# Altium schematic symbol library IC_ADI.SCHLIB: 3169 symbols (part 14 of 181)
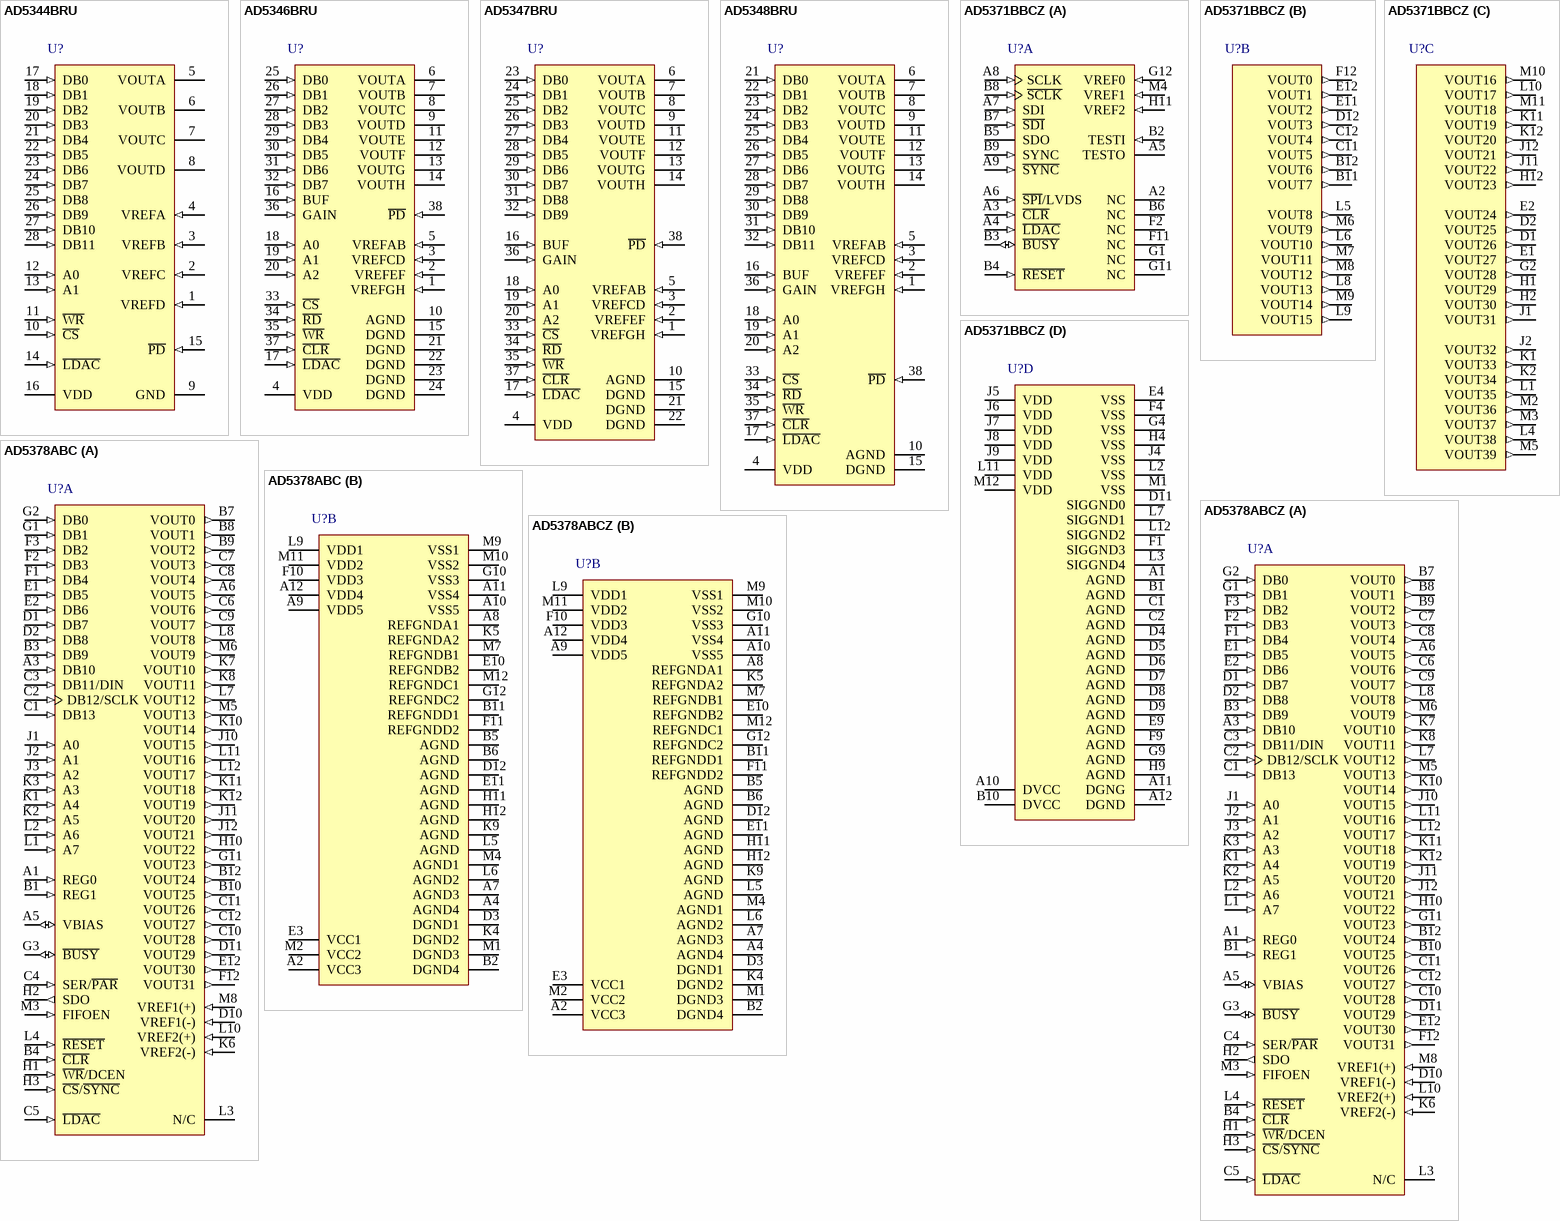
[diagram p204: symbols AD5344BRU to AD5378ABCZ]

## AD5348BRU
designator U?
Octal 12-Bit Voltage Output Digital-to-Analog Converter, 2.5 to 5.5 V, -40 to +105 degC, RU-38, Tube; Generic Part Number: AD5348; PartNumber: AD5348BRU; # DAC Outputs: 8; Max V+: 5.5V; Op Pwr Diss: 8.3mW; Resolution (Bits): 12; Settling Time: 8祍; Single Supply: Yes; DatasheetVersion: Rev.0; PackageVersion: Mar-2003; PackageReference: RU-38; PackageDescription: 38-Lead Thin Shrink Small Outline Package [TSSOP]; Supplier Part Number 1: AD5348BRU-ND; Supplier Part Number 2: 584-AD5348BRU; Packing: Tube; RoHS: N; Mounting Technology: Surface Mount; Code_JEDEC: MS-153BD-1; ComponentLink1Description: Manufacturer URL; ComponentLink2Description: Datasheet; ComponentLink3Description: Package Specification; ComponentLink4Description: Product URL
footprint TSSOP38_0.5 (Footprint not found)
pins: 1 VREFGH (in) "Reference Input for DACs G and H.", 2 VREFEF (in) "Reference Input for DACs E and F.", 3 VREFCD (in) "Reference Input for DACs C and D.", 4 VDD (power) "Power Supply Pin(s). This part can operate from 2.5 V to 5.5 V, and the supply should be decoupled with a 10 uF capacitor in parallel with a 0.1 uF capacitor to GND. Both VDD pins on the LFCSP package must be at the same (See Datasheet)", 5 VREFAB (in) "Reference Input for DACs A and B.", 6 VOUTA (hiz) "Output of DAC A. Buffered output with rail-to-rail operation.", 7 VOUTB (hiz) "Output of DAC B. Buffered output with rail-to-rail operation.", 8 VOUTC (hiz) "Output of DAC C. Buffered output with rail-to-rail operation.", 9 VOUTD (hiz) "Output of DAC D. Buffered output with rail-to-rail operation.", 10 AGND (power) "Analog Ground. Ground reference for analog circuitry.", 11 VOUTE (hiz) "Output of DAC E. Buffered output with rail-to-rail operation.", 12 VOUTF (hiz) "Output of DAC F. Buffered output with rail-to-rail operation.", 13 VOUTG (hiz) "Output of DAC G. Buffered output with rail-to-rail operation.", 14 VOUTH (hiz) "Output of DAC H. Buffered output with rail-to-rail operation.", 15 DGND (power) "Digital Ground. Ground reference for digital circuitry.", 16 BUF (in) "Buffer Control Pin. Controls whether the reference input to the DAC is buffered or unbuffered.", 17 ~{LDAC} (in) "Active Low Control Input. Updates the DAC registers with the contents of the input registers, which allows all DAC outputs to be simultaneously updated.", 18 A0 (in) "LSB Address Pin. Selects which DAC is to be written to.", 19 A1 (in) "Address Pin. Selects which DAC is to be written to.", 20 A2 (in) "MSB Address Pin. Selects which DAC is to be written to.", 21 DB0 (in) "Twelve Parallel Data Input.", 22 DB1 (in) "Twelve Parallel Data Input.", 23 DB2 (in) "Twelve Parallel Data Input.", 24 DB3 (in) "Twelve Parallel Data Input.", 25 DB4 (in) "Twelve Parallel Data Input.", 26 DB5 (in) "Twelve Parallel Data Input.", 27 DB6 (in) "Twelve Parallel Data Input.", 28 DB7 (in) "Twelve Parallel Data Input.", 29 DB8 (in) "Twelve Parallel Data Input.", 30 DB9 (in) "Twelve Parallel Data Input.", 31 DB10 (in) "Twelve Parallel Data Input.", 32 DB11 (in) "Twelve Parallel Data Input. DB11 is the MSB of these 12 bits.", 33 ~{CS} (in) "Active Low Chip Select Input. Used in conjunction with W\R\ to write data to the parallel interface, or with R\D\ to read back data from a DAC.", 34 ~{RD} (in) "Active Low Read Input. Used in conjunction with C\S\ to read data back from the internal DACs.", 35 ~{WR} (in) "Active Low Write Input. Used in conjunction with C\S\ to write data to the parallel interface.", 36 GAIN (in) "Gain Control Pin. Controls whether the output range from the DAC is 0 V to VREF or 0 V to 2 x VREF.", 37 ~{CLR} (in) "Asynchronous Active Low Control Input. Clears all input registers and DAC registers to zeros.", 38 ~{PD} (in) "Power-Down Pin. This active low control pin puts all DACs into power-down mode."

## AD5371BBCZ
designator U?
14-Bit Voltage Output Digital-to-Analog Converter with Serial Interface, -40 to +85 degC, BC-100-2, Pb-Free, Tray; Generic Part Number: AD5371; PartNumber: AD5371BBCZ; # DAC Outputs: 40; Max V+: 16.5V; Op Pwr Diss: 580mW; Resolution (Bits): 14; Settling Time: 20祍; Single Supply: No; DatasheetVersion: Rev.B; PackageVersion: 012006-0; PackageReference: BC-100-2; PackageDescription: 100-Ball Chip Scale Package Ball Grid Array [CSP_BGA]; Supplier Part Number 1: AD5371BBCZ-ND; Supplier Part Number 2: 584-AD5371BBCZ; Packing: Tray; RoHS: Y; Mounting Technology: Surface Mount; Code_JEDEC: MO-205-AC*; ComponentLink1Description: Manufacturer URL; ComponentLink2Description: Datasheet; ComponentLink3Description: Package Specification; ComponentLink4Description: Product URL
footprint BGA100_0.8(10X10) (Footprint not found)
part A pins: A2 NC "No Connect. Do not connect these pins.", A3 ~{CLR} (in) "Asynchronous Clear Input (Level Sensitive, Active Low). See the Clear Function section for more information.", A4 ~{LDAC} (in) "Load DAC Logic Input (Active Low). See the B\U\S\Y\ and L\D\A\C\ Functions section for more information.", A5 TESTO "Test Output Pin. This pin remains unconnected.", A6 ~{SPI}/LVDS (in) "Interface Selection Pin. If the pin is low, the SPI interface is selected. If the pin is high, the LVDS interface is selected.", A7 SDI (in) "Serial Data Input for SPI or LVDS Interface. See the Timing Characteristics section for more details.", A8 SCLK (in) "Serial Clock Input for SPI or LVDS Interface. See the Timing Characteristics section for more details.", A9 ~{SYNC} (in) "Active Low or Differential S\Y\N\C\ Input (Complement) for SPI or LVDS Interface. This is the frame synchronization signal for the SPI or LVDS serial interface. See the Timing Characteristics section for more details.", B2 TESTI (in) "Test Input Pin. Connect this pin to DGND.", B3 ~{BUSY} (io) "Digital Input/Open-Drain Output. B\U\S\Y\ is open drain when an output. See the B\U\S\Y\ and L\D\A\C\ Functions section for more information.", B4 ~{RESET} (in) "Digital Reset Input.", B5 SDO (hiz) "Serial Data Output for SPI Interface. CMOS output. SDO can be used for readback. Data is clocked out on SDO on the rising edge of SCLK and is valid on the falling edge of SCLK.", B6 NC "No Connect. Do not connect these pins.", B7 ~{SDI} (in) "Differential Serial Data Input (Complement) for LVDS Interface. See the Timing Characteristicssection for more details.", B8 ~{SCLK} (in) "Differential Serial Clock Input (Complement) for LVDS Interface. See the Timing Characteristics section for more details.", B9 SYNC (in) "Differential SYNC Input for LVDS Interface. This is the frame synchronization signal for the LVDS serial interface. See the Timing Characteristics section for more details.", F2 NC "No Connect. Do not connect these pins.", F11 NC, G1 NC "No Connect. Do not connect these pins.", G11 NC "No Connect. Do not connect these pins.", G12 VREF0 (in) "Reference Input for DAC 0 to DAC 7. This reference voltage is referred to AGND.", H11 VREF2 (in) "Reference Input for DAC 16 to DAC 39. This reference voltage is referred to AGND.", M4 VREF1 (in) "Reference Input for DAC 8 to DAC 15. This reference voltage is referred to AGND."
part B pins: B11 VOUT7 (out) "DAC Output. Buffered analog outputs for each of the 40 DAC channels. Each analog output is capable of driving an output load of 10 k ohm to ground. Typical output impedance of these amplifiers is 0.5 ohm.", B12 VOUT6 (out) "DAC Output. Buffered analog outputs for each of the 40 DAC channels. Each analog output is capable of driving an output load of 10 k ohm to ground. Typical output impedance of these amplifiers is 0.5 ohm.", C11 VOUT5 (out) "DAC Output. Buffered analog outputs for each of the 40 DAC channels. Each analog output is capable of driving an output load of 10 k ohm to ground. Typical output impedance of these amplifiers is 0.5 ohm.", C12 VOUT4 (out) "DAC Output. Buffered analog outputs for each of the 40 DAC channels. Each analog output is capable of driving an output load of 10 k ohm to ground. Typical output impedance of these amplifiers is 0.5 ohm.", D12 VOUT3 (out) "DAC Output. Buffered analog outputs for each of the 40 DAC channels. Each analog output is capable of driving an output load of 10 k ohm to ground. Typical output impedance of these amplifiers is 0.5 ohm.", E11 VOUT2 (out) "DAC Output. Buffered analog outputs for each of the 40 DAC channels. Each analog output is capable of driving an output load of 10 k ohm to ground. Typical output impedance of these amplifiers is 0.5 ohm.", E12 VOUT1 (out) "DAC Output. Buffered analog outputs for each of the 40 DAC channels. Each analog output is capable of driving an output load of 10 k ohm to ground. Typical output impedance of these amplifiers is 0.5 ohm.", F12 VOUT0 (out) "DAC Output. Buffered analog outputs for each of the 40 DAC channels. Each analog output is capable of driving an output load of 10 k ohm to ground. Typical output impedance of these amplifiers is 0.5 ohm.", L5 VOUT8 (out) "DAC Output. Buffered analog outputs for each of the 40 DAC channels. Each analog output is capable of driving an output load of 10 k ohm to ground. Typical output impedance of these amplifiers is 0.5 ohm.", L6 VOUT10 (out) "DAC Output. Buffered analog outputs for each of the 40 DAC channels. Each analog output is capable of driving an output load of 10 k ohm to ground. Typical output impedance of these amplifiers is 0.5 ohm.", L8 VOUT13 (out) "DAC Output. Buffered analog outputs for each of the 40 DAC channels. Each analog output is capable of driving an output load of 10 k ohm to ground. Typical output impedance of these amplifiers is 0.5 ohm.", L9 VOUT15 (out) "DAC Output. Buffered analog outputs for each of the 40 DAC channels. Each analog output is capable of driving an output load of 10 k ohm to ground. Typical output impedance of these amplifiers is 0.5 ohm.", M6 VOUT9 (out) "DAC Output. Buffered analog outputs for each of the 40 DAC channels. Each analog output is capable of driving an output load of 10 k ohm to ground. Typical output impedance of these amplifiers is 0.5 ohm.", M7 VOUT11 (out) "DAC Output. Buffered analog outputs for each of the 40 DAC channels. Each analog output is capable of driving an output load of 10 k ohm to ground. Typical output impedance of these amplifiers is 0.5 ohm.", M8 VOUT12 (out) "DAC Output. Buffered analog outputs for each of the 40 DAC channels. Each analog output is capable of driving an output load of 10 k ohm to ground. Typical output impedance of these amplifiers is 0.5 ohm.", M9 VOUT14 (out) "DAC Output. Buffered analog outputs for each of the 40 DAC channels. Each analog output is capable of driving an output load of 10 k ohm to ground. Typical output impedance of these amplifiers is 0.5 ohm."
part C pins: D1 VOUT26 (out) "DAC Output. Buffered analog outputs for each of the 40 DAC channels. Each analog output is capable of driving an output load of 10 k ohm to ground. Typical output impedance of these amplifiers is 0.5 ohm.", D2 VOUT25 (out) "DAC Output. Buffered analog outputs for each of the 40 DAC channels. Each analog output is capable of driving an output load of 10 k ohm to ground. Typical output impedance of these amplifiers is 0.5 ohm.", E1 VOUT27 (out) "DAC Output. Buffered analog outputs for each of the 40 DAC channels. Each analog output is capable of driving an output load of 10 k ohm to ground. Typical output impedance of these amplifiers is 0.5 ohm.", E2 VOUT24 (out) "DAC Output. Buffered analog outputs for each of the 40 DAC channels. Each analog output is capable of driving an output load of 10 k ohm to ground. Typical output impedance of these amplifiers is 0.5 ohm.", G2 VOUT28 (out) "DAC Output. Buffered analog outputs for each of the 40 DAC channels. Each analog output is capable of driving an output load of 10 k ohm to ground. Typical output impedance of these amplifiers is 0.5 ohm.", H1 VOUT29 (out) "DAC Output. Buffered analog outputs for each of the 40 DAC channels. Each analog output is capable of driving an output load of 10 k ohm to ground. Typical output impedance of these amplifiers is 0.5 ohm.", H2 VOUT30 (out) "DAC Output. Buffered analog outputs for each of the 40 DAC channels. Each analog output is capable of driving an output load of 10 k ohm to ground. Typical output impedance of these amplifiers is 0.5 ohm.", H12 VOUT23 (out) "DAC Output. Buffered analog outputs for each of the 40 DAC channels. Each analog output is capable of driving an output load of 10 k ohm to ground. Typical output impedance of these amplifiers is 0.5 ohm.", J1 VOUT31 (out) "DAC Output. Buffered analog outputs for each of the 40 DAC channels. Each analog output is capable of driving an output load of 10 k ohm to ground. Typical output impedance of these amplifiers is 0.5 ohm.", J2 VOUT32 (out) "DAC Output. Buffered analog outputs for each of the 40 DAC channels. Each analog output is capable of driving an output load of 10 k ohm to ground. Typical output impedance of these amplifiers is 0.5 ohm.", J11 VOUT22 (out) "DAC Output. Buffered analog outputs for each of the 40 DAC channels. Each analog output is capable of driving an output load of 10 k ohm to ground. Typical output impedance of these amplifiers is 0.5 ohm.", J12 VOUT21 (out) "DAC Output. Buffered analog outputs for each of the 40 DAC channels. Each analog output is capable of driving an output load of 10 k ohm to ground. Typical output impedance of these amplifiers is 0.5 ohm.", K1 VOUT33 (out) "DAC Output. Buffered analog outputs for each of the 40 DAC channels. Each analog output is capable of driving an output load of 10 k ohm to ground. Typical output impedance of these amplifiers is 0.5 ohm.", K2 VOUT34 (out) "DAC Output. Buffered analog outputs for each of the 40 DAC channels. Each analog output is capable of driving an output load of 10 k ohm to ground. Typical output impedance of these amplifiers is 0.5 ohm.", K11 VOUT19 (out) "DAC Output. Buffered analog outputs for each of the 40 DAC channels. Each analog output is capable of driving an output load of 10 k ohm to ground. Typical output impedance of these amplifiers is 0.5 ohm.", K12 VOUT20 (out) "DAC Output. Buffered analog outputs for each of the 40 DAC channels. Each analog output is capable of driving an output load of 10 k ohm to ground. Typical output impedance of these amplifiers is 0.5 ohm.", L1 VOUT35 (out) "DAC Output. Buffered analog outputs for each of the 40 DAC channels. Each analog output is capable of driving an output load of 10 k ohm to ground. Typical output impedance of these amplifiers is 0.5 ohm.", L4 VOUT38 (out) "DAC Output. Buffered analog outputs for each of the 40 DAC channels. Each analog output is capable of driving an output load of 10 k ohm to ground. Typical output impedance of these amplifiers is 0.5 ohm.", L10 VOUT17 (out) "DAC Output. Buffered analog outputs for each of the 40 DAC channels. Each analog output is capable of driving an output load of 10 k ohm to ground. Typical output impedance of these amplifiers is 0.5 ohm.", M2 VOUT36 (out) "DAC Output. Buffered analog outputs for each of the 40 DAC channels. Each analog output is capable of driving an output load of 10 k ohm to ground. Typical output impedance of these amplifiers is 0.5 ohm.", M3 VOUT37 (out) "DAC Output. Buffered analog outputs for each of the 40 DAC channels. Each analog output is capable of driving an output load of 10 k ohm to ground. Typical output impedance of these amplifiers is 0.5 ohm.", M5 VOUT39 (out) "DAC Output. Buffered analog outputs for each of the 40 DAC channels. Each analog output is capable of driving an output load of 10 k ohm to ground. Typical output impedance of these amplifiers is 0.5 ohm.", M10 VOUT16 (out) "DAC Output. Buffered analog outputs for each of the 40 DAC channels. Each analog output is capable of driving an output load of 10 k ohm to ground. Typical output impedance of these amplifiers is 0.5 ohm.", M11 VOUT18 (out) "DAC Output. Buffered analog outputs for each of the 40 DAC channels. Each analog output is capable of driving an output load of 10 k ohm to ground. Typical output impedance of these amplifiers is 0.5 ohm."
part D pins: A1 AGND (power) "Ground for All Analog Circuitry. Connect the AGND pin to the AGND plane.", A10 DVCC (power) "Logic Power Supply; 2.5 V to 5.5 V. Decouple these pins with 0.1 uF ceramic capacitors and 10 uF capacitors.", A11 DGNG (power) "Ground for All Digital Circuitry. Connect both DGND pins to the DGND plane.", A12 DGND (power) "Ground for All Digital Circuitry. Connect both DGND pins to the DGND plane.", B1 AGND (power) "Ground for All Analog Circuitry. Connect the AGND pin to the AGND plane.", B10 DVCC (power) "Logic Power Supply; 2.5 V to 5.5 V. Decouple these pins with 0.1 uF ceramic capacitors and 10 uF capacitors.", C1 AGND (power) "Ground for All Analog Circuitry. Connect the AGND pin to the AGND plane.", C2 AGND (power) "Ground for All Analog Circuitry. Connect the AGND pin to the AGND plane.", D4 AGND (power) "Ground for All Analog Circuitry. Connect the AGND pin to the AGND plane.", D5 AGND (power) "Ground for All Analog Circuitry. Connect the AGND pin to the AGND plane.", D6 AGND (power) "Ground for All Analog Circuitry. Connect the AGND pin to the AGND plane.", D7 AGND (power) "Ground for All Analog Circuitry. Connect the AGND pin to the AGND plane.", D8 AGND (power) "Ground for All Analog Circuitry. Connect the AGND pin to the AGND plane.", D9 AGND (power) "Ground for All Analog Circuitry. Connect the AGND pin to the AGND plane.", D11 SIGGND0 (power) "Reference Ground for DAC 0 to DAC 7. VOUT0 to VOUT7 are referenced to this voltage.", E4 VSS (power) "Negative Analog Power Supply; ?16.5 V to ?8 V for specified performance. Decouple these pins with 0.1 uF ceramic capacitors and 10 uF capacitors.", E9 AGND (power) "Ground for All Analog Circuitry. Connect the AGND pin to the AGND plane.", F1 SIGGND3 (power) "Reference Ground for DAC 24 to DAC 31. VOUT24 to VOUT31 are referenced to this voltage.", F4 VSS (power) "Negative Analog Power Supply; ?16.5 V to ?8 V for specified performance. Decouple these pins with 0.1 uF ceramic capacitors and 10 uF capacitors.", F9 AGND (power) "No Connect. Do not connect these pins.", G4 VSS (power) "Negative Analog Power Supply; ?16.5 V to ?8 V for specified performance. Decouple these pins with 0.1 uF ceramic capacitors and 10 uF capacitors.", G9 AGND (power) "Ground for All Analog Circuitry. Connect the AGND pin to the AGND plane.", H4 VSS (power) "Negative Analog Power Supply; ?16.5 V to ?8 V for specified performance. Decouple these pins with 0.1 uF ceramic capacitors and 10 uF capacitors.", H9 AGND (power) "Ground for All Analog Circuitry. Connect the AGND pin to the AGND plane.", J4 VSS (power) "Negative Analog Power Supply; ?16.5 V to ?8 V for specified performance. Decouple these pins with 0.1 uF ceramic capacitors and 10 uF capacitors.", J5 VDD (power) "Positive Analog Power Supply; 9 V to 16.5 V for specified performance. Decouple these pins with 0.1 uF ceramic capacitors and 10 uF capacitors.", J6 VDD (power) "Positive Analog Power Supply; 9 V to 16.5 V for specified performance. Decouple these pins with 0.1 uF ceramic capacitors and 10 uF capacitors.", J7 VDD (power) "Positive Analog Power Supply; 9 V to 16.5 V for specified performance. Decouple these pins with 0.1 uF ceramic capacitors and 10 uF capacitors.", J8 VDD (power) "Positive Analog Power Supply; 9 V to 16.5 V for specified performance. Decouple these pins with 0.1 uF ceramic capacitors and 10 uF capacitors.", J9 VDD (power) "Positive Analog Power Supply; 9 V to 16.5 V for specified performance. Decouple these pins with 0.1 uF ceramic capacitors and 10 uF capacitors.", L2 VSS (power) "Negative Analog Power Supply; -16.5 V to ?8 V for specified performance. Decouple these pins with 0.1 uF ceramic capacitors and 10 uF capacitors.", L3 SIGGND4 (power) "Reference Ground for DAC 32 to DAC 39. VOUT32 to VOUT39 are referenced to this voltage.", L7 SIGGND1 (power) "Reference Ground for DAC 8 to DAC 15. VOUT8 to VOUT15 are referenced to this voltage.", L11 VDD (power) "Positive Analog Power Supply; 9 V to 16.5 V for specified performance. Decouple these pins with 0.1 uF ceramic capacitors and 10 uF capacitors.", L12 SIGGND2 (power) "Reference Ground for DAC 16 to DAC 23. VOUT16 to VOUT23 are referenced to this voltage.", M1 VSS (power) "Negative Analog Power Supply; -16.5 V to ?8 V for specified performance. Decouple these pins with 0.1 uF ceramic capacitors and 10 uF capacitors.", M12 VDD (power) "Positive Analog Power Supply; 9 V to 16.5 V for specified performance. Decouple these pins with 0.1 uF ceramic capacitors and 10 uF capacitors."

## AD5378ABC
designator U?
32 Channel 14-Bit Bipolar Voltage Output Digital-to-Analog Converter with Parallel and Serial Interface, -40 to +85 degC, BC-108-2, Tray; Generic Part Number: AD5378; PartNumber: AD5378ABC; # DAC Outputs: 32; Max V+: 16.5V; Op Pwr Diss: 850mW; Resolution (Bits): 14; Settling Time: 20祍; Single Supply: No; DatasheetVersion: Rev.A; PackageVersion: 012006-0; PackageReference: BC-108-2; PackageDescription: 108-Ball Chip Scale Package Ball Grid Array [CSP_BGA]; Supplier Part Number 1: AD5378ABC-ND; Supplier Part Number 2: 584-AD5378ABC; Packing: Tray; RoHS: N; Mounting Technology: Surface Mount; Code_JEDEC: MO-192-AAD-1; ComponentLink1Description: Manufacturer URL; ComponentLink2Description: Datasheet; ComponentLink3Description: Package Specification; ComponentLink4Description: Product URL
footprint BGA108_1.0(13X13) (Footprint not found)
part A pins: A1 REG0 (in) "Parallel Interface Register Select Input. This pin is used together with REG1 to select data registers, gain registers, offset registers, increment/decrement mode, or the soft reset function. See Table 12.", A3 DB10 (in) "Parallel Data Input.", A5 VBIAS (io) "DAC Bias Voltage Input/Output. This pin provides an access to the on-chip voltage generator voltage. It is provided for bypassing and overdriving purposes only. If VREF(+) > 4.25 V, VBIAS must be pulled high externally to an (See Datasheet)", A6 VOUT5 (out) "DAC Output. Buffered analog outputs for each of the 32 DAC channels. Each analog output can drive an output load of 5 k ohm to ground. Typical output impedance of these amplifiers is 1 ohm.", B1 REG1 (in) "Parallel Interface Register Select Input. This pin is used together with REG0 to select data registers, gain registers, offset registers, increment/decrement mode, or the soft reset function. See Table 12.", B3 DB9 (in) "Parallel Data Input.", B4 ~{CLR} (in) "Asynchronous Clear Input. Level sensitive, active low. When C\L\R\ is low, the input to each of the DAC output buffer stages, VOUT0 to VOUT31, is switched to the externally set potential on the relevant REFGND pin. While (See Datasheet)", B7 VOUT0 (out) "DAC Output. Buffered analog outputs for each of the 32 DAC channels. Each analog output can drive an output load of 5 k ohm to ground. Typical output impedance of these amplifiers is 1 ohm.", B8 VOUT1 (out) "DAC Output. Buffered analog outputs for each of the 32 DAC channels. Each analog output can drive an output load of 5 k ohm to ground. Typical output impedance of these amplifiers is 1 ohm.", B9 VOUT2 (out) "DAC Output. Buffered analog outputs for each of the 32 DAC channels. Each analog output can drive an output load of 5 k ohm to ground. Typical output impedance of these amplifiers is 1 ohm.", B10 VOUT25 (out) "DAC Output. Buffered analog outputs for each of the 32 DAC channels. Each analog output can drive an output load of 5 k ohm to ground. Typical output impedance of these amplifiers is 1 ohm.", B12 VOUT24 (out) "DAC Output. Buffered analog outputs for each of the 32 DAC channels. Each analog output can drive an output load of 5 k ohm to ground. Typical output impedance of these amplifiers is 1 ohm.", C1 DB13 (in) "Parallel Data Input. DB13 is the MSB.", C2 DB12/SCLK (in) "Parallel Data Input. / Serial Clock Input. Data is clocked into the shift register on the falling edge of SCLK. This pin operates at clock speeds up to 50 MHz.", C3 DB11/DIN (in) "Parallel Data Input. / Serial Data Input. Data must be valid on the falling edge of SCLK.", C4 SER/~{PAR} (in) "Interface Select Input. This pin allows the user to select whether the serial or parallel interface is used. This pin has an internal 1 M ohm pull-down resistor, meaning that the default state at power-on is parallel mode. (See Datasheet)", C5 ~{LDAC} (in) "Load DAC Logic Input. Active low. If L\D\A\C\ is taken low while B\U\S\Y\ is inactive (high), the contents of the input registers are transferred to the DAC registers, and the DAC outputs are updated. If L\D\A\C\ is taken (See Datasheet)", C6 VOUT6 (out) "DAC Output. Buffered analog outputs for each of the 32 DAC channels. Each analog output can drive an output load of 5 k ohm to ground. Typical output impedance of these amplifiers is 1 ohm.", C7 VOUT3 (out) "DAC Output. Buffered analog outputs for each of the 32 DAC channels. Each analog output can drive an output load of 5 k ohm to ground. Typical output impedance of these amplifiers is 1 ohm.", C8 VOUT4 (out) "DAC Output. Buffered analog outputs for each of the 32 DAC channels. Each analog output can drive an output load of 5 k ohm to ground. Typical output impedance of these amplifiers is 1 ohm.", C9 VOUT7 (out) "DAC Output. Buffered analog outputs for each of the 32 DAC channels. Each analog output can drive an output load of 5 k ohm to ground. Typical output impedance of these amplifiers is 1 ohm.", C10 VOUT28 (out) "DAC Output. Buffered analog outputs for each of the 32 DAC channels. Each analog output can drive an output load of 5 k ohm to ground. Typical output impedance of these amplifiers is 1 ohm.", C11 VOUT26 (out) "DAC Output. Buffered analog outputs for each of the 32 DAC channels. Each analog output can drive an output load of 5 k ohm to ground. Typical output impedance of these amplifiers is 1 ohm.", C12 VOUT27 (out) "DAC Output. Buffered analog outputs for each of the 32 DAC channels. Each analog output can drive an output load of 5 k ohm to ground. Typical output impedance of these amplifiers is 1 ohm.", D1 DB7 (in) "Parallel Data Input.", D2 DB8 (in) "Parallel Data Input.", D10 VREF1(-) (in) "Reference Inputs for DACs 0 to 5, 8 to 13, 16 to 21, and 24 to 30. These voltages are referred to AGND.", D11 VOUT29 (out) "DAC Output. Buffered analog outputs for each of the 32 DAC channels. Each analog output can drive an output load of 5 k ohm to ground. Typical output impedance of these amplifiers is 1 ohm.", E1 DB5 (in) "Parallel Data Input.", E2 DB6 (in) "Parallel Data Input.", E12 VOUT30 (out) "DAC Output. Buffered analog outputs for each of the 32 DAC channels. Each analog output can drive an output load of 5 k ohm to ground. Typical output impedance of these amplifiers is 1 ohm.", F1 DB4 (in) "Parallel Data Input.", F2 DB3 (in) "Parallel Data Input.", F3 DB2 (in) "Parallel Data Input.", F12 VOUT31 (out) "DAC Output. Buffered analog outputs for each of the 32 DAC channels. Each analog output can drive an output load of 5 k ohm to ground. Typical output impedance of these amplifiers is 1 ohm.", G1 DB1 (in) "Parallel Data Input.", G2 DB0 (in) "Parallel Data Input. DB0 is the LSB.", G3 ~{BUSY} (io) "Digital Input/Open-Drain Output. This pin must be pulled high with a pull-up resistor for correct operation. B\U\S\Y\ goes low during internal calculations of x2. During this time, the user can continue writing new data to (See Datasheet)", G11 VOUT23 (out) "DAC Output. Buffered analog outputs for each of the 32 DAC channels. Each analog output can drive an output load of 5 k ohm to ground. Typical output impedance of these amplifiers is 1 ohm.", H1 ~{WR}/DCEN (in) "Parallel Interface Write Input. Edge sensitive. The rising edge of W\R\ is used in conjunction with C\S\ low and the address bus inputs to write to the selected AD5378 registers. / Daisy-Chain Select Input. Level sensitive, (See Datasheet)", H2 SDO (out) "Serial Data Output. CMOS output. SDO can be used for daisy-chaining several devices together. Data is clocked out on SDO on the rising edge of SCLK and is valid on the falling edge of SCLK.", H3 ~{CS}/~{SYNC} (in) "Parallel Interface Chip Select Input. Level sensitive, active low. When this pin is low, the device is selected. / Active Low Input. This is the frame synchronization signal for the serial interface.", H10 VOUT22 (out) "DAC Output. Buffered analog outputs for each of the 32 DAC channels. Each analog output can drive an output load of 5 k ohm to ground. Typical output impedance of these amplifiers is 1 ohm.", J1 A0 (in) "Parallel Address Input. A7 to A4 are decoded to select one group or multiple groups of registers (input registers, gain registers (m), or offset registers (c)) for a data transfer. This pin is used in conjunction with the (See Datasheet)", J2 A1 (in) "Parallel Address Input. A7 to A4 are decoded to select one group or multiple groups of registers (input registers, gain registers (m), or offset registers (c)) for a data transfer. This pin is used in conjunction with the (See Datasheet)", J3 A2 (in) "Parallel Address Input. A7 to A4 are decoded to select one group or multiple groups of registers (input registers, gain registers (m), or offset registers (c)) for a data transfer. This pin is used in conjunction with the (See Datasheet)", J10 VOUT15 (out) "DAC Output. Buffered analog outputs for each of the 32 DAC channels. Each analog output can drive an output load of 5 k ohm to ground. Typical output impedance of these amplifiers is 1 ohm.", J11 VOUT20 (out) "DAC Output. Buffered analog outputs for each of the 32 DAC channels. Each analog output can drive an output load of 5 k ohm to ground. Typical output impedance of these amplifiers is 1 ohm.", J12 VOUT21 (out) "DAC Output. Buffered analog outputs for each of the 32 DAC channels. Each analog output can drive an output load of 5 k ohm to ground. Typical output impedance of these amplifiers is 1 ohm.", K1 A4 (in) "Parallel Address Input. A7 to A4 are decoded to select one group or multiple groups of registers (input registers, gain registers (m), or offset registers (c)) for a data transfer. This pin is used in conjunction with the (See Datasheet)", K2 A5 (in) "Parallel Address Input. A7 to A4 are decoded to select one group or multiple groups of registers (input registers, gain registers (m), or offset registers (c)) for a data transfer. This pin is used in conjunction with the (See Datasheet)", K3 A3 (in) "Parallel Address Input. A7 to A4 are decoded to select one group or multiple groups of registers (input registers, gain registers (m), or offset registers (c)) for a data transfer. This pin is used in conjunction with the (See Datasheet)", K6 VREF2(-) (in) "Reference Inputs for DACs 6, 7, 14, 15, 22, 23, 30, and 31. These reference voltages are referred to AGND.", K7 VOUT10 (out) "DAC Output. Buffered analog outputs for each of the 32 DAC channels. Each analog output can drive an output load of 5 k ohm to ground. Typical output impedance of these amplifiers is 1 ohm.", K8 VOUT11 (out) "DAC Output. Buffered analog outputs for each of the 32 DAC channels. Each analog output can drive an output load of 5 k ohm to ground. Typical output impedance of these amplifiers is 1 ohm.", K10 VOUT14 (out) "DAC Output. Buffered analog outputs for each of the 32 DAC channels. Each analog output can drive an output load of 5 k ohm to ground. Typical output impedance of these amplifiers is 1 ohm.", K11 VOUT18 (out) "DAC Output. Buffered analog outputs for each of the 32 DAC channels. Each analog output can drive an output load of 5 k ohm to ground. Typical output impedance of these amplifiers is 1 ohm.", K12 VOUT19 (out) "DAC Output. Buffered analog outputs for each of the 32 DAC channels. Each analog output can drive an output load of 5 k ohm to ground. Typical output impedance of these amplifiers is 1 ohm.", L1 A7 (in) "Parallel Address Input. A7 to A4 are decoded to select one group or multiple groups of registers (input registers, gain registers (m), or offset registers (c)) for a data transfer. This pin is used in conjunction with the (See Datasheet)", L2 A6 (in) "Parallel Address Input. A7 to A4 are decoded to select one group or multiple groups of registers (input registers, gain registers (m), or offset registers (c)) for a data transfer. This pin is used in conjunction with the (See Datasheet)", L3 N/C "No Connect.", L4 ~{RESET} (in) "Asynchronous Digital Reset Input. Falling edge sensitive. If unused, R\E\S\E\T\ can be left unconnected; an internal pull-up resistor (1 M ohm) ensures that the R\E\S\E\T\ input is held high. The function of this pin is (See Datasheet)", L7 VOUT12 (out) "DAC Output. Buffered analog outputs for each of the 32 DAC channels. Each analog output can drive an output load of 5 k ohm to ground. Typical output impedance of these amplifiers is 1 ohm.", L8 VOUT8 (out) "DAC Output. Buffered analog outputs for each of the 32 DAC channels. Each analog output can drive an output load of 5 k ohm to ground. Typical output impedance of these amplifiers is 1 ohm.", L10 VREF2(+) (in) "Reference Inputs for DACs 6, 7, 14, 15, 22, 23, 30, and 31. These reference voltages are referred to AGND.", L11 VOUT16 (out) "DAC Output. Buffered analog outputs for each of the 32 DAC channels. Each analog output can drive an output load of 5 k ohm to ground. Typical output impedance of these amplifiers is 1 ohm.", L12 VOUT17 (out) "DAC Output. Buffered analog outputs for each of the 32 DAC channels. Each analog output can drive an output load of 5 k ohm to ground. Typical output impedance of these amplifiers is 1 ohm.", M3 FIFOEN (in) "FIFO Enable. Level sensitive, active high. When connected to DVDD, the internal FIFO is enabled, allowing the user to write to the device at full speed. FIFO is available in both serial and parallel modes. The FIFOEN pin has (See Datasheet)", M5 VOUT13 (out) "DAC Output. Buffered analog outputs for each of the 32 DAC channels. Each analog output can drive an output load of 5 k ohm to ground. Typical output impedance of these amplifiers is 1 ohm.", M6 VOUT9 (out) "DAC Output. Buffered analog outputs for each of the 32 DAC channels. Each analog output can drive an output load of 5 k ohm to ground. Typical output impedance of these amplifiers is 1 ohm.", M8 VREF1(+) (in) "Reference Inputs for DACs 0 to 5, 8 to 13, 16 to 21, and 24 to 30. These voltages are referred to AGND."
part B pins: A2 VCC3 (power) "Logic Power Supply. 2.7 V to 5.5 V. These pins should be decoupled with 0.1 uF ceramic capacitors and 10 uF tantalum capacitors.", A4 AGND4 (power) "Ground for All Analog Circuitry. All AGND pins should be connected to the AGND plane.", A7 AGND3 (power) "Ground for All Analog Circuitry. All AGND pins should be connected to the AGND plane.", A8 REFGNDA1 (power) "Reference Ground for DACs 0 to 5. VOUT0 to VOUT5 are referenced to this voltage.", A9 VDD5 (power) "Positive Analog Power Supply. +11.4 V to +16.5 V for specified performance. These pins should be decoupled with 0.1 uF ceramic capacitors and 10 uF tantalum capacitors.", A10 VSS5 (power) "Negative Analog Power Supply. -11.4 V to -16.5 V for specified performance. These pins should be decoupled with 0.1 uF ceramic capacitors and 10 uF tantalum capacitors.", A11 VSS4 (power) "Negative Analog Power Supply. -11.4 V to -16.5 V for specified performance. These pins should be decoupled with 0.1 uF ceramic capacitors and 10 uF tantalum capacitors.", A12 VDD4 (power) "Positive Analog Power Supply. +11.4 V to +16.5 V for specified performance. These pins should be decoupled with 0.1 uF ceramic capacitors and 10 uF tantalum capacitors.", B2 DGND4 (power) "Ground for All Digital Circuitry. All DGND pins should be connected to the DGND plane.", B5 AGND (power) "Ground for All Analog Circuitry. All AGND pins should be connected to the AGND plane.", B6 AGND (power) "Ground for All Analog Circuitry. All AGND pins should be connected to the AGND plane.", B11 REFGNDD1 (power) "Reference Ground for DACs 24 to 29. VOUT24 to VOUT29 are referenced to this voltage.", D3 DGND1 (power) "Ground for All Digital Circuitry. All DGND pins should be connected to the DGND plane.", D12 AGND (power) "Ground for All Analog Circuitry. All AGND pins should be connected to the AGND plane.", E3 VCC1 (power) "Logic Power Supply. 2.7 V to 5.5 V. These pins should be decoupled with 0.1 uF ceramic capacitors and 10 uF tantalum capacitors.", E10 REFGNDB2 (power) "Reference Ground for DACs 14 and 15. VOUT14 and VOUT15 are referenced to this voltage.", E11 AGND (power) "Ground for All Analog Circuitry. All AGND pins should be connected to the AGND plane.", F10 VDD3 (power) "Positive Analog Power Supply. +11.4 V to +16.5 V for specified performance. These pins should be decoupled with 0.1 uF ceramic capacitors and 10 uF tantalum capacitors.", F11 REFGNDD2 (power) "Reference Ground for DACs 30 and 31. VOUT30 and VOUT31 are referenced to this voltage.", G10 VSS3 (power) "Negative Analog Power Supply. -11.4 V to -16.5 V for specified performance. These pins should be decoupled with 0.1 uF ceramic capacitors and 10 uF tantalum capacitors.", G12 REFGNDC2 (power) "Reference Ground for DACs 22 and 23. VOUT22 and VOUT23 are referenced to this voltage.", H11 AGND (power) "Ground for All Analog Circuitry. All AGND pins should be connected to the AGND plane.", H12 AGND (power) "Ground for All Analog Circuitry. All AGND pins should be connected to the AGND plane.", K4 DGND2 (power) "Ground for All Digital Circuitry. All DGND pins should be connected to the DGND plane.", K5 REFGNDA2 (power) "Reference Ground for DACs 6 and 7. VOUT6 and VOUT7 are referenced to this voltage.", K9 AGND (power) "Ground for All Analog Circuitry. All AGND pins should be connected to the AGND plane.", L5 AGND (power) "Ground for All Analog Circuitry. All AGND pins should be connected to the AGND plane.", L6 AGND2 (power) "Ground for All Analog Circuitry. All AGND pins should be connected to the AGND plane.", L9 VDD1 (power) "Positive Analog Power Supply. +11.4 V to +16.5 V for specified performance. These pins should be decoupled with 0.1 uF ceramic capacitors and 10 uF tantalum capacitors.", M1 DGND3 (power) "Ground for All Digital Circuitry. All DGND pins should be connected to the DGND plane.", M2 VCC2 (power) "Logic Power Supply. 2.7 V to 5.5 V. These pins should be decoupled with 0.1 uF ceramic capacitors and 10 uF tantalum capacitors.", M4 AGND1 (power) "Ground for All Analog Circuitry. All AGND pins should be connected to the AGND plane.", M7 REFGNDB1 (power) "Reference Ground for DACs 8 to 13. VOUT8 to VOUT13 are referenced to this voltage.", M9 VSS1 (power) "Negative Analog Power Supply. -11.4 V to -16.5 V for specified performance. These pins should be decoupled with 0.1 uF ceramic capacitors and 10 uF tantalum capacitors.", M10 VSS2 (power) "Negative Analog Power Supply. -11.4 V to -16.5 V for specified performance. These pins should be decoupled with 0.1 uF ceramic capacitors and 10 uF tantalum capacitors.", M11 VDD2 (power) "Positive Analog Power Supply. +11.4 V to +16.5 V for specified performance. These pins should be decoupled with 0.1 uF ceramic capacitors and 10 uF tantalum capacitors.", M12 REFGNDC1 (power) "Reference Ground for DACs 16 to 21. VOUT16 to VOUT21 are referenced to this voltage."